# Altium footprint library ref-packages-longpad.PCBLIB: 1527 footprints (part 70 of 103)
Each footprint in its own frame and in the unit in brackets; x right, y up, seen from the top. Pads: shape width x height; smd on the part's side, far side on the other; paste and mask are expansions set on the pad; w line width, h text height; cw(c..) or ccw(c..) is an arc to the next point about the centre after c.
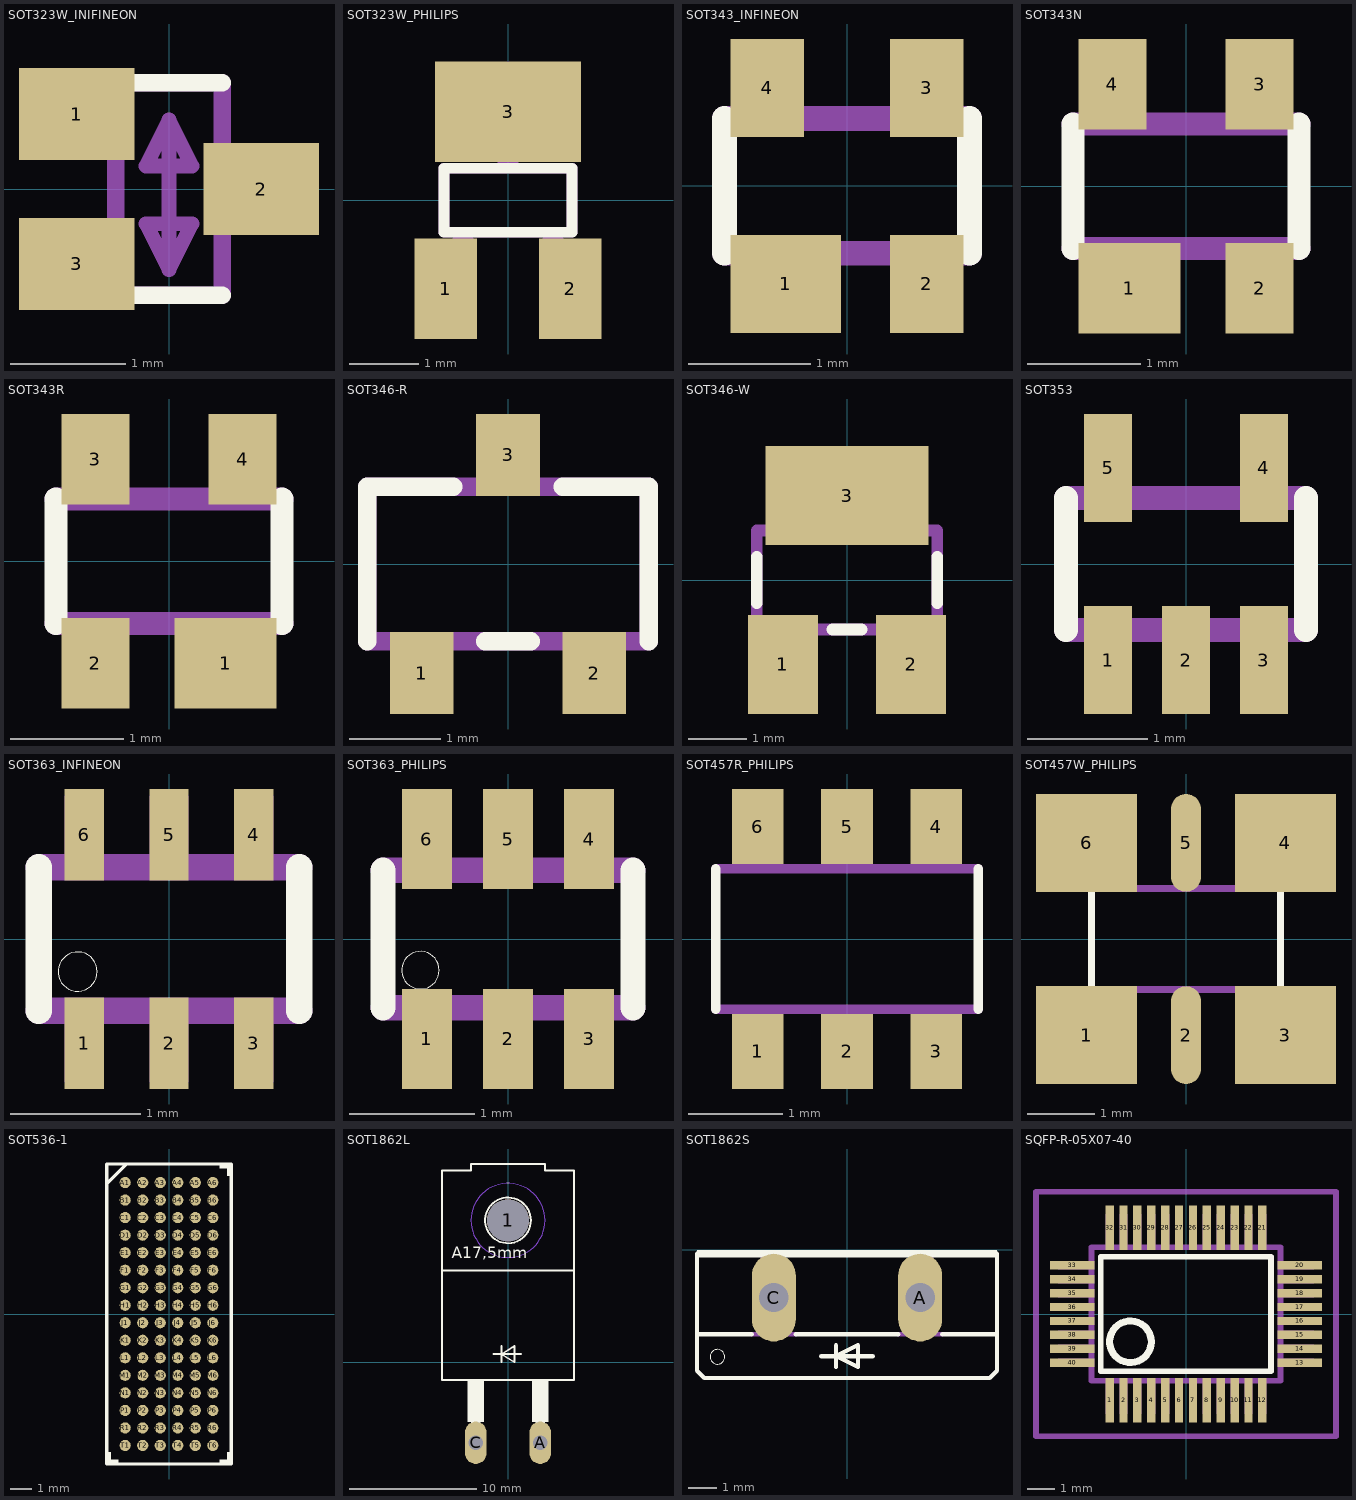
[diagram p69: the footprints below, top view; thin cyan lines are the x and y axes]

## SOT323W_INIFINEON [mil]
pads (3):
  rect 39.37x31.5 smd: 1(-31.5,25.59) 2(31.5,0) 3(-31.5,-25.59)
Top Overlay:
  lines w6: -18.13,-36.32 18.13,-36.32 ; -18.13,36.32 18.13,36.32
Mechanical 13:
  lines w5: 0,-27.56 0,23.62 ; 0,-27.56 7.87,-11.81 -7.87,-11.81 0,-27.56 ; 0,23.62 -7.87,7.87 7.87,7.87 0,23.62
  text "direction of pcb" at 15.75,15.75 h15.5
  text "transportation for" at 15.75,-1.97 h15.5
  text "wavesoldering" at 15.75,-19.69 h15.5
Mechanical 16:
  rectangle: -43.31,19.69 -19.69,31.5
  rectangle: -43.31,-31.5 -19.69,-19.69
  rectangle: 19.69,-5.91 43.31,5.91
  lines w6: -18.13,-36.32 18.13,-36.32 18.13,36.32 -18.13,36.32 -18.13,-36.32

## SOT323W_PHILIPS [mil]
pads (3):
  rect 35.43x57.09 smd: 1(-35.43,-50.2) 2(35.43,-50.2)
  rect 82.68x57.09 smd: 3(0,50.2)
Top Overlay:
  lines w6: -36.32,-18.13 36.32,-18.13 36.32,18.13 -36.32,18.13 -36.32,-18.13
Mechanical 16:
  rectangle: -31.5,-43.31 -19.69,-19.69
  rectangle: 19.69,-43.31 31.5,-19.69
  rectangle: -5.91,19.69 5.91,43.31
  lines w6: -36.32,-18.13 36.32,-18.13 36.32,18.13 -36.32,18.13 -36.32,-18.13

## SOT343_INFINEON [mil]
pads (4):
  rect 35.43x31.5 smd: 1(-19.69,-31.5)
  rect 23.62x31.5 smd: 2(25.59,-31.5) 3(25.59,31.5) 4(-25.59,31.5)
Top Overlay:
  lines w8: -39.37,-21.65 -39.37,21.65 ; 39.37,-21.65 39.37,21.65
Mechanical 16:
  rectangle: -33.46,-43.31 -5.91,-23.62
  rectangle: 17.72,-43.31 33.46,-23.62
  rectangle: 17.72,23.62 33.46,43.31
  rectangle: -33.46,23.62 -17.72,43.31
  lines w8: -39.37,-21.65 39.37,-21.65 ; -39.37,21.65 39.37,21.65

## SOT343N [mil]
pads (4):
  rect 35.43x31.5 smd: 1(-19.69,-35.43)
  rect 23.62x31.5 smd: 2(25.59,-35.43) 3(25.59,35.43) 4(-25.59,35.43)
Top Overlay:
  lines w8: -39.37,-21.65 -39.37,21.65 ; 39.37,-21.65 39.37,21.65
Mechanical 16:
  rectangle: -33.46,-43.31 -5.91,-23.62
  rectangle: 17.72,-43.31 33.46,-23.62
  rectangle: 17.72,23.62 33.46,43.31
  rectangle: -33.46,23.62 -17.72,43.31
  lines w8: -39.37,-21.65 39.37,-21.65 ; -39.37,21.65 39.37,21.65

## SOT343R [mil]
pads (4):
  rect 35.43x31.5 smd: 1(19.69,-35.43)
  rect 23.62x31.5 smd: 2(-25.59,-35.43) 3(-25.59,35.43) 4(25.59,35.43)
Top Overlay:
  lines w8: -39.37,-21.65 -39.37,21.65 ; 39.37,-21.65 39.37,21.65
Mechanical 16:
  rectangle: 5.91,-43.31 33.46,-23.62
  rectangle: -33.46,-43.31 -17.72,-23.62
  rectangle: -33.46,23.62 -17.72,43.31
  rectangle: 17.72,23.62 33.46,43.31
  lines w8: -39.37,-21.65 39.37,-21.65 ; -39.37,21.65 39.37,21.65

## SOT346-R [mil]
pads (3):
  rect 27.56x35.43 smd: 1(-37.4,-47.24) 2(37.4,-47.24) 3(0,47.24)
Top Overlay:
  lines w8: -61.02,-33.46 -61.02,33.46 -23.62,33.46 ; -9.84,-33.46 9.84,-33.46 ; 23.62,33.46 61.02,33.46 61.02,-33.46
Mechanical 16:
  rectangle: -45.28,-59.06 -29.53,-37.4
  rectangle: 29.53,-59.06 45.28,-37.4
  rectangle: -7.87,37.4 7.87,59.06
  lines w8: -61.02,-33.46 61.02,-33.46 61.02,33.46 -61.02,33.46 -61.02,-33.46

## SOT346-W [mil]
pads (3):
  rect 47.24x66.93 smd: 1(-43.31,-57.09) 2(43.31,-57.09)
  rect 110.24x66.93 smd: 3(0,57.09)
Top Overlay:
  lines w8: -61.02,-15.75 -61.02,15.75 ; -9.84,-33.46 9.84,-33.46 ; 61.02,-15.75 61.02,15.75
Mechanical 16:
  rectangle: -45.28,-59.06 -29.53,-37.4
  rectangle: 29.53,-59.06 45.28,-37.4
  rectangle: -7.87,37.4 7.87,59.06
  lines w8: -61.02,-33.46 61.02,-33.46 61.02,33.46 -61.02,33.46 -61.02,-33.46

## SOT353 [mil]
pads (5):
  rect 15.75x35.43 smd: 1(-25.59,-31.5) 2(0,-31.5) 3(25.59,-31.5) 4(25.59,31.5) 5(-25.59,31.5)
Top Overlay:
  lines w8: -39.37,-21.65 -39.37,21.65 ; 39.37,-21.65 39.37,21.65
Mechanical 16:
  rectangle: -5.91,-43.31 5.91,-25.59
  rectangle: -31.5,-43.31 -19.69,-25.59
  rectangle: 19.69,-43.31 31.5,-25.59
  rectangle: 19.69,25.59 31.5,43.31
  rectangle: -31.5,25.59 -19.69,43.31
  lines w8: -39.37,-21.65 39.37,-21.65 ; -39.37,21.65 39.37,21.65

## SOT363_INFINEON [mil]
pads (6):
  rect 11.81x27.56 smd: 1(-25.59,-31.5) 2(0,-31.5) 3(25.59,-31.5) 4(25.59,31.5) 5(0,31.5) 6(-25.59,31.5)
Top Overlay:
  circle w0: c-27.56,-9.84 r5.91
  lines w8: -39.37,-21.65 -39.37,21.65 ; 39.37,-21.65 39.37,21.65
Mechanical 16:
  rectangle: -31.5,-43.31 -19.69,-23.62
  rectangle: -5.91,-43.31 5.91,-23.62
  rectangle: 19.69,-43.31 31.5,-23.62
  rectangle: 19.69,23.62 31.5,43.31
  rectangle: -5.91,23.62 5.91,43.31
  rectangle: -31.5,23.62 -19.69,43.31
  lines w8: -39.37,-21.65 39.37,-21.65 ; -39.37,21.65 39.37,21.65

## SOT363_PHILIPS [mil]
pads (6):
  rect 15.75x31.5 smd: 1(-25.59,-31.5) 2(0,-31.5) 3(25.59,-31.5) 4(25.59,31.5) 5(0,31.5) 6(-25.59,31.5)
Top Overlay:
  circle w0: c-27.56,-9.84 r5.91
  lines w8: -39.37,-21.65 -39.37,21.65 ; 39.37,-21.65 39.37,21.65
Mechanical 16:
  rectangle: -31.5,-43.31 -19.69,-23.62
  rectangle: -5.91,-43.31 5.91,-23.62
  rectangle: 19.69,-43.31 31.5,-23.62
  rectangle: 19.69,23.62 31.5,43.31
  rectangle: -5.91,23.62 5.91,43.31
  rectangle: -31.5,23.62 -19.69,43.31
  lines w8: -39.37,-21.65 39.37,-21.65 ; -39.37,21.65 39.37,21.65

## SOT457R_PHILIPS [mil]
pads (6):
  rect 21.65x31.5 smd: 1(-37.4,-47.24) 2(0,-47.24) 3(37.4,-47.24) 4(37.4,47.24) 5(0,47.24) 6(-37.4,47.24)
Top Overlay:
  lines w4: -55.12,-29.53 -55.12,29.53 ; 55.12,-29.53 55.12,29.53
Mechanical 16:
  rectangle: -44.29,-51.18 -30.51,-30.51
  rectangle: -6.89,-51.18 6.89,-30.51
  rectangle: 30.51,-51.18 44.29,-30.51
  rectangle: 30.51,30.51 44.29,51.18
  rectangle: -6.89,30.51 6.89,51.18
  rectangle: -44.29,30.51 -30.51,51.18
  lines w4: -55.12,-29.53 55.12,-29.53 ; -55.12,29.53 55.12,29.53

## SOT457W_PHILIPS [mil]
pads (6):
  rect 59.06x57.09 smd: 1(-58.07,-56.1) 3(58.07,-56.1) 4(58.07,56.1) 6(-58.07,56.1)
  rrect100% 17.72x57.09 smd: 2(0,-56.1) 5(0,56.1)
Top Overlay:
  lines w4: -55.12,-29.53 -55.12,29.53 ; 55.12,-29.53 55.12,29.53
Mechanical 16:
  rectangle: -44.29,-51.18 -30.51,-30.51
  rectangle: -6.89,-51.18 6.89,-30.51
  rectangle: 30.51,-51.18 44.29,-30.51
  rectangle: 30.51,30.51 44.29,51.18
  rectangle: -6.89,30.51 6.89,51.18
  rectangle: -44.29,30.51 -30.51,51.18
  lines w4: -55.12,-29.53 55.12,-29.53 ; -55.12,29.53 55.12,29.53

## SOT536-1 [mm]
pads (96):
  rrect100% 0.51x0.51 smd: A1(-2,6) A2(-1.2,6) A3(-0.4,6) A4(0.4,6) A5(1.2,6) A6(2,6) B1(-2,5.2) B2(-1.2,5.2) B3(-0.4,5.2) B4(0.4,5.2) B5(1.2,5.2) B6(2,5.2) C1(-2,4.4) C2(-1.2,4.4) C3(-0.4,4.4) C4(0.4,4.4) C5(1.2,4.4) C6(2,4.4) D1(-2,3.6) D2(-1.2,3.6) D3(-0.4,3.6) D4(0.4,3.6) D5(1.2,3.6) D6(2,3.6) E1(-2,2.8) E2(-1.2,2.8) E3(-0.4,2.8) E4(0.4,2.8) E5(1.2,2.8) E6(2,2.8) F1(-2,2) F2(-1.2,2) F3(-0.4,2) F4(0.4,2) F5(1.2,2) F6(2,2) G1(-2,1.2) G2(-1.2,1.2) G3(-0.4,1.2) G4(0.4,1.2) G5(1.2,1.2) G6(2,1.2) H1(-2,0.4) H2(-1.2,0.4) H3(-0.4,0.4) H4(0.4,0.4) H5(1.2,0.4) H6(2,0.4) J1(-2,-0.4) J2(-1.2,-0.4) J3(-0.4,-0.4) J4(0.4,-0.4) J5(1.2,-0.4) J6(2,-0.4) K1(-2,-1.2) K2(-1.2,-1.2) K3(-0.4,-1.2) K4(0.4,-1.2) K5(1.2,-1.2) K6(2,-1.2) L1(-2,-2) L2(-1.2,-2) L3(-0.4,-2) L4(0.4,-2) L5(1.2,-2) L6(2,-2) M1(-2,-2.8) M2(-1.2,-2.8) M3(-0.4,-2.8) M4(0.4,-2.8) M5(1.2,-2.8) M6(2,-2.8) N1(-2,-3.6) N2(-1.2,-3.6) N3(-0.4,-3.6) N4(0.4,-3.6) N5(1.2,-3.6) N6(2,-3.6) P1(-2,-4.4) P2(-1.2,-4.4) P3(-0.4,-4.4) P4(0.4,-4.4) P5(1.2,-4.4) P6(2,-4.4) R1(-2,-5.2) R2(-1.2,-5.2) R3(-0.4,-5.2) R4(0.4,-5.2) R5(1.2,-5.2) R6(2,-5.2) T1(-2,-6) T2(-1.2,-6) T3(-0.4,-6) T4(0.4,-6) T5(1.2,-6) T6(2,-6)
Top Overlay:
  rectangle: 2.3,6.65 2.8,6.8
  rectangle: 2.65,6.3 2.8,6.8
  rectangle: 2.65,-6.8 2.8,-6.3
  rectangle: 2.3,-6.8 2.8,-6.65
  rectangle: -2.8,-6.8 -2.3,-6.65
  rectangle: -2.8,-6.8 -2.65,-6.3
  lines w0.152: -2.8,6 -2,6.8 ; -2.85,-6.85 2.85,-6.85 2.85,6.85 -2.85,6.85 -2.85,-6.85

## SOT1862L [mil]
pads (3):
  round 130 hole 130: 1(0,440)
  oval 66x132 hole 44: A(100,-250) C(-100,-250)
Bottom Layer keep-out:
  circle w0: c0,440 r115
Top Overlay:
  circle w6: c0,440 r71
  rectangle: -125,-185 -75,-55
  rectangle: 75,-185 125,-55
  rectangle: 85,-190 115,-185
  rectangle: -115,-190 -85,-185
  lines w6: -45,25 -20,25 ; -20,0 -20,25 ; -20,50 -20,25 ; 40,25 -20,25 ; -205,285 -205,-55 205,-55 205,285 ; -205,285 205,285 ; -205,285 -205,595 -115,595 -115,615 115,615 115,595 205,595 205,285 ; -20,25 20,0 20,50 -20,25
  text "A17,5mm" at -175,310 h60.45
Mechanical 16:
  rectangle: 85,-255 115,-190
  rectangle: -115,-255 -85,-190
Via Holes:
  circle w0: c0,440 r115

## SOT1862S [mil]
pads (2):
  oval 60x120 hole 40: A(100,-65) C(-100,-65)
Top Overlay:
  circle w0: c-177,-146 r10
  rectangle: -205,-10 205,0
  lines w6: -205,-5 -205,-115 ; -130,-115 -205,-115 ; -70,-115 70,-115 ; -35,-145 -15,-145 ; -15,-160 -15,-145 ; -15,-130 -15,-145 ; 35,-145 -15,-145 ; 130,-115 205,-115 ; 205,-5 205,-115 ; -205,-115 -205,-165 -195,-175 195,-175 205,-165 205,-115 ; -15,-145 15,-130 15,-160 -15,-145
Mechanical 16:
  lines w6: -130,-115 -115,-115 ; -115,-5 -115,-115 ; -70,-115 -115,-115 ; 70,-115 115,-115 ; 115,-5 115,-115 ; 130,-115 115,-115

## SQFP-R-05X07-40 [mil]
pads (40):
  rect 11.81x62.99 smd: 1(-108.27,-122.05) 2(-88.58,-122.05) 3(-68.9,-122.05) 4(-49.21,-122.05) 5(-29.53,-122.05) 6(-9.84,-122.05) 7(9.84,-122.05) 8(29.53,-122.05) 9(49.21,-122.05) 10(68.9,-122.05) 11(88.58,-122.05) 12(108.27,-122.05) 21(108.27,122.05) 22(88.58,122.05) 23(68.9,122.05) 24(49.21,122.05) 25(29.53,122.05) 26(9.84,122.05) 27(-9.84,122.05) 28(-29.53,122.05) 29(-49.21,122.05) 30(-68.9,122.05) 31(-88.58,122.05) 32(-108.27,122.05)
  rect 62.99x11.81 smd: 13(161.42,-68.9) 14(161.42,-49.21) 15(161.42,-29.53) 16(161.42,-9.84) 17(161.42,9.84) 18(161.42,29.53) 19(161.42,49.21) 20(161.42,68.9) 33(-161.42,68.9) 34(-161.42,49.21) 35(-161.42,29.53) 36(-161.42,9.84) 37(-161.42,-9.84) 38(-161.42,-29.53) 39(-161.42,-49.21) 40(-161.42,-68.9)
Top Overlay:
  circle w10: c-78.74,-39.37 r29.53
  lines w8: -120.87,-81.1 120.47,-81.1 120.47,81.1 -120.87,81.1 -120.87,-81.1
Mechanical 16:
  rectangle: -114.17,-141.73 -102.36,-96.46
  rectangle: 133.86,-74.8 181.1,-62.99
  rectangle: -94.49,-141.73 -82.68,-96.46
  rectangle: -74.8,-141.73 -62.99,-96.46
  rectangle: -55.12,-141.73 -43.31,-96.46
  rectangle: -35.43,-141.73 -23.62,-96.46
  rectangle: -15.75,-141.73 -3.94,-96.46
  rectangle: 3.94,-141.73 15.75,-96.46
  rectangle: 23.62,-141.73 35.43,-96.46
  rectangle: 43.31,-141.73 55.12,-96.46
  rectangle: 62.99,-141.73 74.8,-96.46
  rectangle: 82.68,-141.73 94.49,-96.46
  rectangle: 102.36,-141.73 114.17,-96.46
  rectangle: 133.86,-55.12 181.1,-43.31
  rectangle: 133.86,-35.43 181.1,-23.62
  rectangle: 133.86,-15.75 181.1,-3.94
  rectangle: 133.86,3.94 181.1,15.75
  rectangle: 133.86,23.62 181.1,35.43
  rectangle: 133.86,43.31 181.1,55.12
  rectangle: 133.86,62.99 181.1,74.8
  rectangle: 102.36,96.46 114.17,141.73
  rectangle: 82.68,96.46 94.49,141.73
  rectangle: 62.99,96.46 74.8,141.73
  rectangle: 43.31,96.46 55.12,141.73
  rectangle: 23.62,96.46 35.43,141.73
  rectangle: 3.94,96.46 15.75,141.73
  rectangle: -15.75,96.46 -3.94,141.73
  rectangle: -35.43,96.46 -23.62,141.73
  rectangle: -55.12,96.46 -43.31,141.73
  rectangle: -74.8,96.46 -62.99,141.73
  rectangle: -94.49,96.46 -82.68,141.73
  rectangle: -114.17,96.46 -102.36,141.73
  rectangle: -181.1,62.99 -133.86,74.8
  rectangle: -181.1,43.31 -133.86,55.12
  rectangle: -181.1,23.62 -133.86,35.43
  rectangle: -181.1,3.94 -133.86,15.75
  rectangle: -181.1,-15.75 -133.86,-3.94
  rectangle: -181.1,-35.43 -133.86,-23.62
  rectangle: -181.1,-55.12 -133.86,-43.31
  rectangle: -181.1,-74.8 -133.86,-62.99
  lines w8: -133.86,-94.49 133.86,-94.49 133.86,94.49 -133.86,94.49 -133.86,-94.49
Mechanical 27:
  lines w7.87: -212.6,-173.23 -212.6,173.23 212.6,173.23 212.6,-173.23 -212.6,-173.23